# Altium integrated library Al IC.IntLib: 73 symbols
Pins are listed as number, name and electrical type; pins without a type are passive.

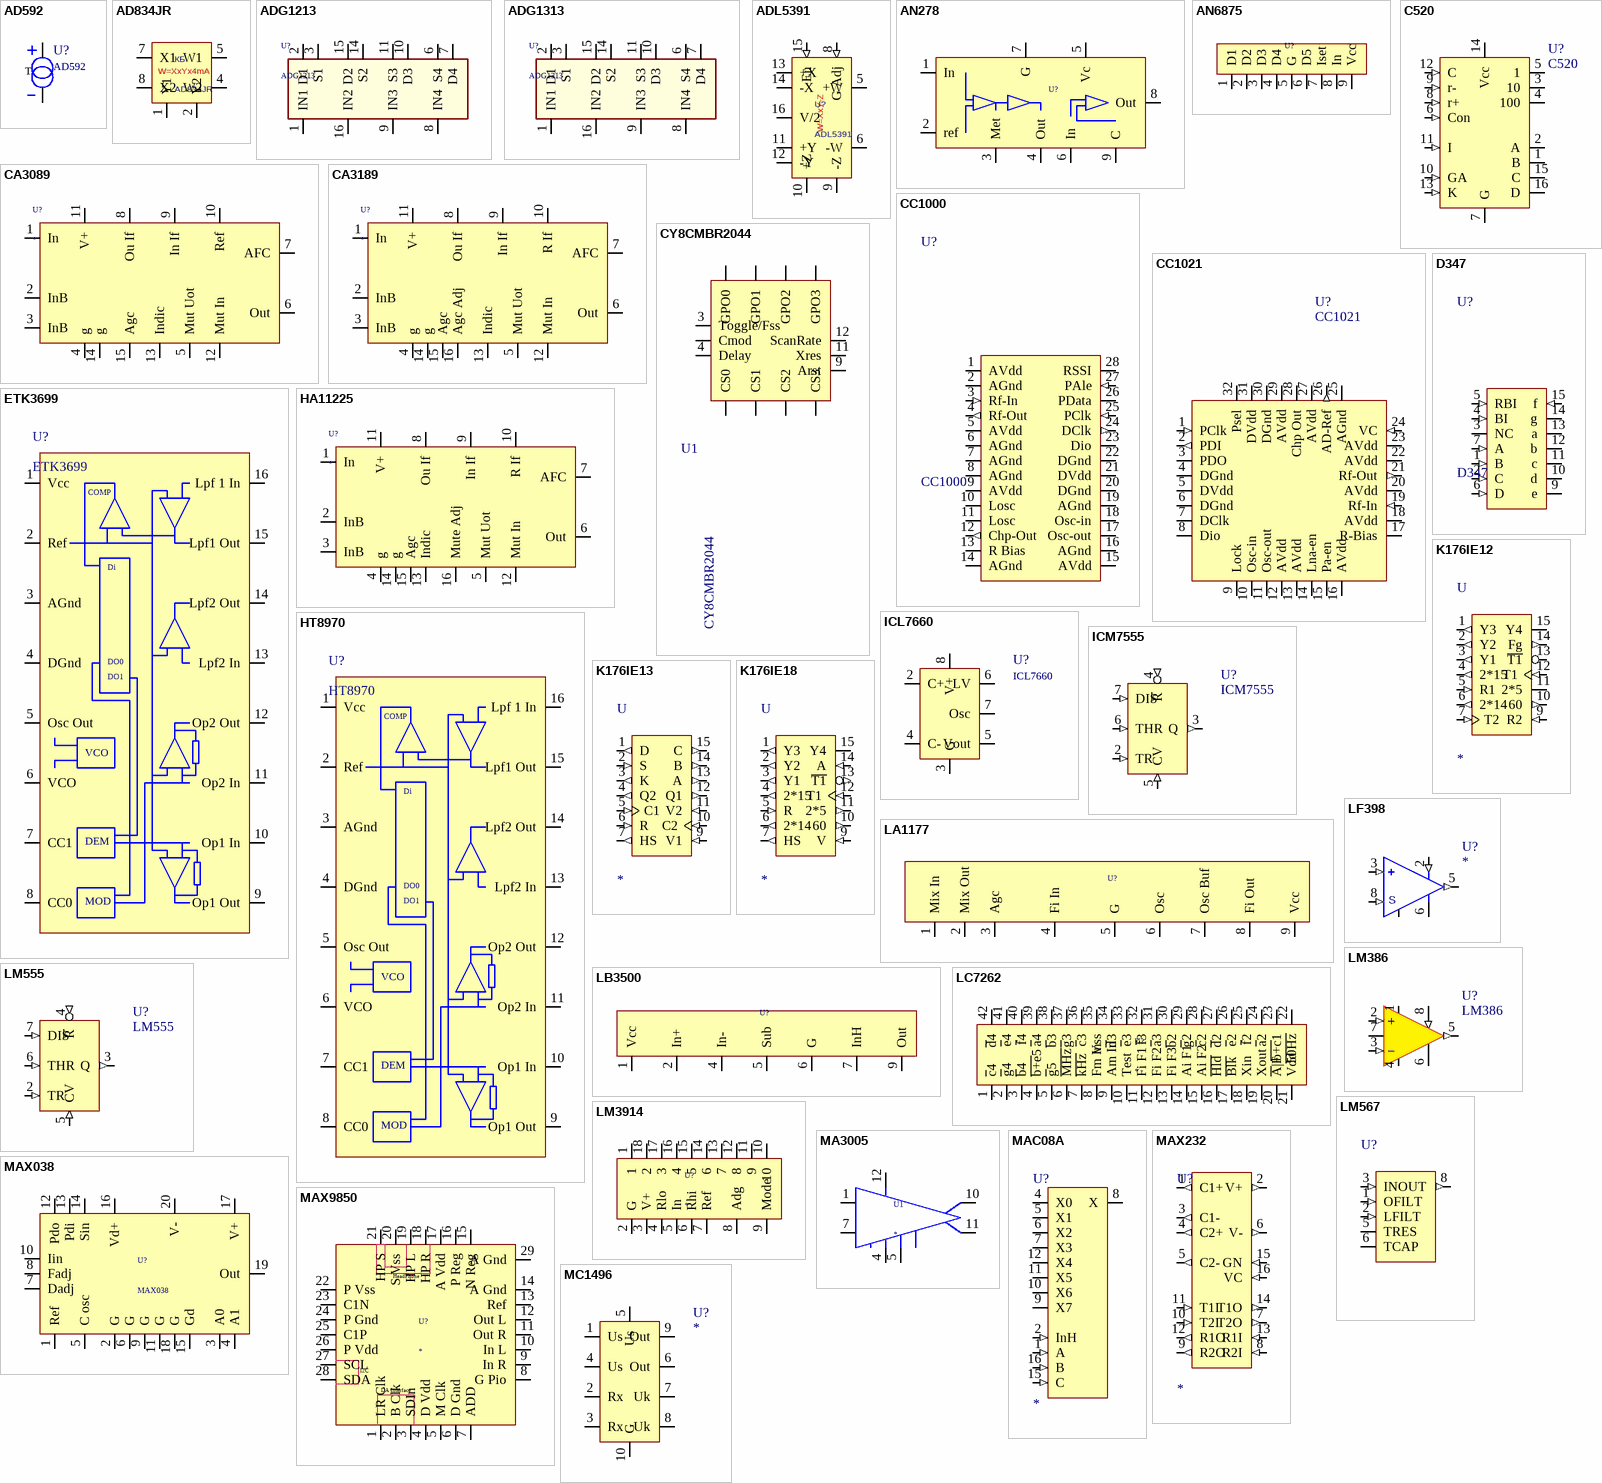
[diagram p0: symbols AD592 to MC1496]

## AD592
designator U?
Temperature Sensor; Price: 5.62
footprint TO92C
pins: 1 (power), 2 nc hidden, 3 (power)
text: T

## AD834JR
designator КБ
500 MHz Four-Quadrant Multiplier 8-18V +11mA -28mA; Price: 64
footprint SO8-150
pins: 1 Y1 (power), 2 Y2 (power), 3 -Vs (power) hidden to -Vs, 4 W2 (power), 5 W1 (power), 6 +Vs (power) hidden to +Vs, 7 X1 (power), 8 X2 (power)
text: W=XxYx4mA

## ADG1213
designator U?
Multiplexer 4x1
pins: 1 IN1, 2 D1, 3 S1, 4 Vss (power) hidden to Vss, 5 Gnd (power) hidden to Gnd, 6 S4, 7 D4, 8 IN4, 9 IN3, 10 D3, 11 S3, 12 NC hidden, 13 Vdd (power) hidden to Vdd, 14 S2, 15 D2, 16 IN2

## ADG1313
designator U?
Multiplexer 4x1
pins: 1 IN1, 2 D1, 3 S1, 4 Vss (power) hidden to Vss, 5 Gnd (power) hidden to Gnd, 6 S4, 7 D4, 8 IN4, 9 IN3, 10 D3, 11 S3, 12 NC hidden, 13 Vdd (power) hidden to Vdd, 14 S2, 15 D2, 16 IN2

## ADL5391
designator U?
2000 MHz Four-Quadrant Multiplier 5V  130mA; Price: 26.5
footprint LFCSP 3x3 0.5mm
pins: 0 PP (power) hidden to g, 1 Vs- (power) hidden to Vs-, 2 Vs+ (power) hidden to Vs+, 3 Vs+ (power) hidden to Vs+, 4 Vs+ (power) hidden to Vs+, 5 +W (power), 6 -W (power), 7 Vs- (power) hidden to Vs-, 8 G Adj (in), 9 -Z, 10 +Z, 11 +Y (power), 12 -Y (power), 13 +X (power), 14 -X (power), 15 En (in), 16 V/2 (power)
text: W=XxY-Z

## AN278
designator U?
FM-IFPre; Price: 0.7
footprint SIP9
pins: 1 In, 2 ref, 3 Met, 4 Out, 5 Vc, 6 In, 7 G, 8 Out, 9 C

## AN6875
designator U?
5 Led Log Dot; Price: 1.8
footprint SIP9
pins: 1 D1, 2 D2, 3 D3, 4 D4, 5 G, 6 D5, 7 Iset, 8 In, 9 Vcc

## C520
designator U?
ADC 3 digital; Price: 13.5
footprint DIL16-300a
pins: 1 B (oc), 2 A (oc), 3 10 (oc), 4 100 (oc), 5 1 (oc), 6 Con (in), 7 G, 8 r+ (in), 9 r- (in), 10 GA (in), 11 I (in), 12 C (in), 13 K (in), 14 Vcc, 15 C (oc), 16 D (oc)

## CA3089
designator U?
FM-IF
footprint DIL16-300a
pins: 1 In, 2 InB, 3 InB, 4 g, 5 Mut Uot, 6 Out, 7 AFC, 8 Ou If, 9 In If, 10 Ref, 11 V+, 12 Mut In, 13 Indic, 14 g, 15 Agc

## CA3189
designator U?
FM-IF
footprint DIL16-300a
pins: 1 In, 2 InB, 3 InB, 4 g, 5 Mut Uot, 6 Out, 7 AFC, 8 Ou If, 9 In If, 10 R If, 11 V+, 12 Mut In, 13 Indic, 14 g, 15 Agc, 16 Agc Adj

## CC1000
designator U?
RX-TX
footprint TSSOP28
pins: 1 AVdd (power), 2 AGnd (power), 3 Rf-In (in), 4 Rf-Out (out), 5 AVdd (power), 6 AGnd (power), 7 AGnd (power), 8 AGnd (power), 9 AVdd (power), 10 Losc, 11 Losc, 12 Chp-Out (out), 13 R Bias, 14 AGnd (power), 15 AVdd (power), 16 AGnd (power), 17 Osc-out, 18 Osc-in, 19 AGnd (power), 20 DGnd (power), 21 DVdd (power), 22 DGnd (power), 23 Dio (io), 24 DClk (out), 25 PClk (in), 26 PData (io), 27 PAle (in), 28 RSSI

## CC1021
designator U?
RX-TX; Price: 8.93
footprint QFN-32
pins: 1 PClk (in), 2 PDI (out), 3 PDO (io), 4 DGnd (power), 5 DVdd (power), 6 DGnd (power), 7 DClk (power), 8 Dio (io), 9 Lock (power), 10 Osc-in, 11 Osc-out, 12 AVdd (power), 13 AVdd (power), 14 Lna-en (power), 15 Pa-en, 16 AVdd (power), 17 R-Bias (power), 18 AVdd, 19 Rf-In (in), 20 AVdd, 21 Rf-Out (out), 22 AVdd (power), 23 AVdd (power), 24 VC (in), 25 AGnd (power), 26 AD-Ref (out), 27 AVdd, 28 Chp Out, 29 AVdd, 30 DGnd (power), 31 DVdd (power), 32 Psel

## CY8CMBR2044
designator U1
Cypress CY8CMBR2044-24LKXI
footprint QFN50P3X3-16V2M (QFN, 16-Leads, Body 3x3mm, Pitch 0.5mm, IPC Low Density)
pins: 1 GPO1, 2 GPO0, 3 Toggle/Fss, 4 Delay (power), 5 CS0, 6 CS1, 7 Vss hidden to Vss, 8 CS2, 9 Arst, 10 CS3, 11 Xres, 12 ScanRate (power), 13 Vcc (power) hidden to Vcc, 14 GPO3, 15 Cmod, 16 GPO2

## D347
designator U?
7 Segment Deshifrator; Price: 4.07
footprint DIL16-300a
pins: 1 B (in), 2 C (in), 3 NC, 4 BI (in), 5 RBI (in), 6 D (in), 7 A (in), 8 GND (power) hidden to Gnd, 9 e (oc), 10 d (oc), 11 c (oc), 12 b (oc), 13 a (oc), 14 g (oc), 15 f (in), 16 Vcc (power) hidden to Vcc
1 alternate drawing of the same symbol

## ETK3699
designator U?
Ехо
footprint DIL16-300a
pins: 1 Vcc, 2 Ref, 3 AGnd, 4 DGnd, 5 Osc Out, 6 VCO, 7 CC1, 8 CC0, 9 Op1 Out, 10 Op1 In, 11 Op2 In, 12 Op2 Out, 13 Lpf2 In, 14 Lpf2 Out, 15 Lpf1 Out, 16 Lpf 1 In
text: COMP; Di; DO0; DO1; DEM; MOD

## HA11225
designator U?
FM-IF
footprint DIL16-300a
pins: 1 In, 2 InB, 3 InB, 4 g, 5 Mut Uot, 6 Out, 7 AFC, 8 Ou If, 9 In If, 10 R If, 11 V+, 12 Mut In, 13 Indic, 14 g, 15 Agc, 16 Mute Adj

## HT8970
designator U?
Ехо
footprint DIL16-300a
pins: 1 Vcc, 2 Ref, 3 AGnd, 4 DGnd, 5 Osc Out, 6 VCO, 7 CC1, 8 CC0, 9 Op1 Out, 10 Op1 In, 11 Op2 In, 12 Op2 Out, 13 Lpf2 In, 14 Lpf2 Out, 15 Lpf1 Out, 16 Lpf 1 In
text: COMP; Di; DO0; DO1; DEM; MOD

## ICL7660
designator U?
DC-DC +5/-5V
footprint DIL8-300a
pins: 1 hidden to NC, 2 C+, 3 G, 4 C-, 5 Vout, 6 LV, 7 Osc, 8 V+

## ICM7555
designator U?
Timer CMOS SMD SO8
footprint SO8-150
pins: 1 GND (power) hidden to GND, 2 TR (in), 3 Q (out), 4 ~{R} (in), 5 CV (in), 6 THR (in), 7 DIS (in), 8 VCC (power) hidden to VCC

## K176IE12
designator U
/60
footprint DIL16-300a
pins: 1 Y3 (out), 2 Y2 (out), 3 Y1 (out), 4 2*15 (out), 5 R1 (in), 6 2*14 (out), 7 T2 (in), 8 VSS (power) hidden to VSS, 9 R2 (in), 10 60 (out), 11 2*5, 12 T1 (in), 13 ~{T1}, 14 Fg (out), 15 Y4, 16 VDD (power) hidden to VDD

## K176IE13
designator U
/60
footprint DIL16-300a
pins: 1 D (out), 2 S (in), 3 K (out), 4 Q2 (out), 5 C1 (in), 6 R (in), 7 HS (out), 8 VSS (power) hidden to VSS, 9 V1 (in), 10 C2 (in), 11 V2 (in), 12 Q1 (out), 13 A (out), 14 B (out), 15 C (out), 16 VDD (power) hidden to VDD

## K176IE18
designator U
/60
footprint DIL16-300a
pins: 1 Y3 (out), 2 Y2 (out), 3 Y1 (out), 4 2*15 (out), 5 R (in), 6 2*14 (out), 7 HS (out), 8 VSS (power) hidden to VSS, 9 V (in), 10 60 (out), 11 2*5 (out), 12 T1 (in), 13 ~{T1} (out), 14 A (in), 15 Y4, 16 VDD (power) hidden to VDD

## LA1177
designator U?
FM Tuner 8-9V; Price: 1.2
footprint SIP9
pins: 1 Mix In, 2 Mix Out, 3 Agc, 4 Fi In, 5 G, 6 Osc, 7 Osc Buf, 8 Fi Out, 9 Vcc

## LB3500
designator U?
1/8 Prescaler 30-150MHz; Price: 2.25
footprint SIP9
pins: 1 Vcc, 2 In+, 3 nc hidden, 4 In-, 5 Sub, 6 G, 7 InH, 8 nc hidden, 9 Out

## LC7262
designator U?
Цифрова Скала FM-AM; Price: 4.5
footprint DIL42S-600
pins: 1 ~{c}4 (oc), 2 ~{g}4 (oc), 3 ~{b}4 (oc), 4 ~{b+e}5 (oc), 5 ~{g}5 (oc), 6 ~{MHz} (oc), 7 ~{kHz} (oc), 8 Fm In (oc), 9 Am In (oc), 10 Test (oc), 11 Fi F1 (oc), 12 Fi F2 (oc), 13 Fi F3 (oc), 14 Ai F1 (oc), 15 Ai F2 (oc), 16 ~{Hld} (oc), 17 ~{Blk} (oc), 18 Xin (oc), 19 Xout (oc), 20 ~{A}|F (oc), 21 Vdd (oc), 22 ~{50Hz} (oc), 23 ~{b+c}1 (oc), 24 ~{a}2 (oc), 25 ~{f}2 (oc), 26 ~{e}2 (oc), 27 ~{d}2 (oc), 28 ~{c}2 (oc), 29 ~{g}2 (oc), 30 ~{b}2 (oc), 31 ~{a}3 (oc), 32 ~{f}3 (oc), 33 ~{e}3 (oc), 34 ~{d}3 (oc), 35 Vss (oc), 36 ~{c}3 (oc), 37 ~{g}3 (oc), 38 ~{b}3 (oc), 39 ~{a}4 (oc), 40 ~{f}4 (oc), 41 ~{e}4 (oc), 42 ~{d}4 (oc)

## LF398
designator U?
S-H; Price: 2.018
footprint DIL8-300a
pins: 1 V+ (power) hidden to V+, 2 OFFSET (in), 3 IN (in), 4 V- (power) hidden to V-, 5 OUT (out), 6 CAP, 7 LOGRF (in), 8 LOG (in)
text: S

## LM386
designator U?
1W
footprint DIL8-300a
pins: 1 GAIN (in), 2 IN+ (in), 3 IN- (in), 4 GND, 5 OUT (out), 6 V+, 7 BYPASS, 8 GAIN (in)

## LM555
designator U?
Timer
footprint DIL8-300a
footprint SO8-150
pins: 1 GND (power) hidden to GND, 2 TR (in), 3 Q (out), 4 ~{R} (in), 5 CV (in), 6 THR (in), 7 DIS (in), 8 VCC (power) hidden to VCC

## LM567
designator U?
PLL
footprint DIL8-300a
pins: 1 OFILT (in), 2 LFILT (in), 3 IN (in), 4 V+ (power) hidden to V+, 5 TRES, 6 TCAP, 7 GND (power) hidden to GND, 8 OUT (out)

## LM3914
designator U?
10 Led Bar/Dot Lin; Price: 3.9
footprint DIL18-300a
pins: 1 (oc), 2 G (oc), 3 V+ (oc), 4 Rlo (oc), 5 In (oc), 6 Rhi (oc), 7 Ref (oc), 8 Adg (oc), 9 Mode (oc), 10 (oc), 11 9 (oc), 12 8 (oc), 13 7 (oc), 14 6 (oc), 15 5 (oc), 16 4 (oc), 17 3 (oc), 18 2 (oc)

## MA3005
designator U1
Dif UC
footprint TO12
pins: 1 +I, 2 e (power) hidden to Gnd, 3 B hidden, 4, 5, 6 hidden, 7 -I, 8 Ve (power) hidden to Ve, 9 Vc (power) hidden to Vc, 10 +Out, 11 -Out, 12 +V

## MAC08A
designator U?
Multiplexer 8x1
footprint DIL16-300a
pins: 1 A (in), 2 InH (in), 3 VEE (power) hidden to VEE, 4 X0 (io), 5 X1 (io), 6 X2 (io), 7 X3 (io), 8 X (io), 9 X7 (io), 10 X6 (io), 11 X5 (io), 12 X4 (io), 13 VDD (power) hidden to VDD, 14 VSS (power) hidden to VSS, 15 C (in), 16 B (in)

## MAX038
designator U?
Function Gen; Price: 20лв
footprint DIL20-300a
pins: 1 Ref, 2 G, 3 A0, 4 A1, 5 C osc, 6 G, 7 Dadj, 8 Fadj, 9 G, 10 Iin, 11 G, 12 Pdo, 13 Pdi, 14 Sin, 15 Gd, 16 Vd+, 17 V+, 18 G, 19 Out, 20 V-

## MAX232
designator U?
RS232
footprint DIL16-300a
pins: 1 C1+ (out), 2 V+ (out), 3 C1- (out), 4 C2+ (out), 5 C2- (out), 6 V- (out), 7 T2O (out), 8 R2I (in), 9 R2O (out), 10 T2I (in), 11 T1I (in), 12 R1O (out), 13 R1I (in), 14 T1O (out), 15 GN (in), 16 VC (in)

## MAX9850
designator U?
footprint QFN28 (QFN, 28-Leads, Body 5x5mm, Pitch 0.5mm, NSC Recommended)
pins: 1 LR Clk, 2 B Clk, 3 SDIn, 4 D Vdd, 5 M Clk, 6 D Gnd, 7 ADD, 8 G Pio, 9 In R, 10 In L, 11 Out R, 12 Out L, 13 Ref, 14 A Gnd, 15 N Reg, 16 P Reg, 17 A Vdd, 18 HP R, 19 HP L, 20 S Vss, 21 HP S, 22 P Vss, 23 C1N, 24 P Gnd, 25 C1P, 26 P Vdd, 27 SCL, 28 SDA, 29 A Gnd
text: HeadPhone; I2C; DA Interface

## MC1496
designator U?
Driver
footprint TO10 (Footprint not found)
pins: 1 Us, 2 Rx, 3 Rx, 4 Us, 5 Us, 6 Out, 7 Uk, 8 Uk, 9 Out, 10 G

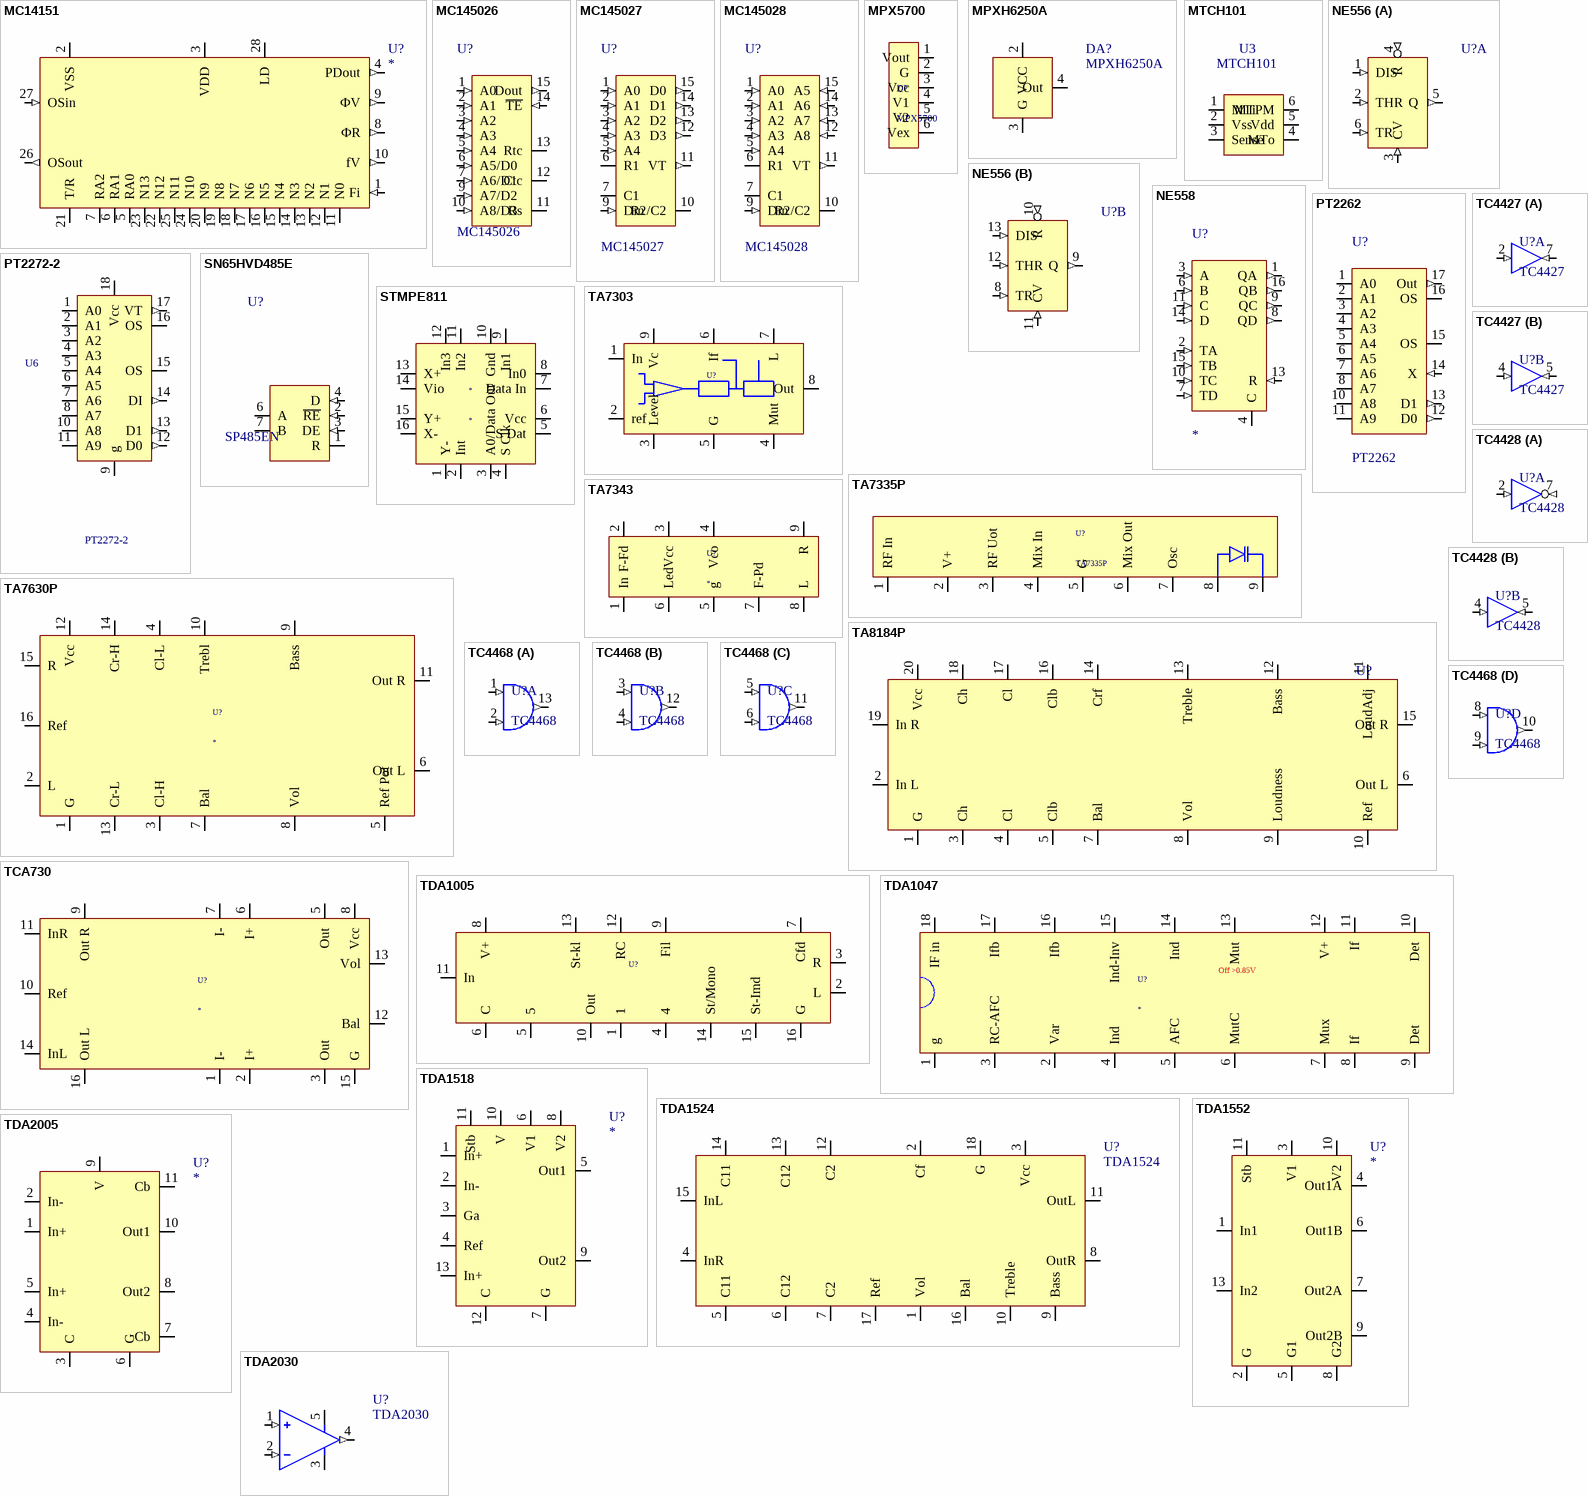
[diagram p1: symbols MC14151 to TDA2030]

## MC14151
designator U?
PLL
footprint DIL28-600a
pins: 1 Fi (in), 2 VSS (power), 3 VDD (power), 4 PDout (out), 5 RA0, 6 RA1, 7 RA2, 8 ФR (out), 9 ФV (out), 10 fV (out), 11 N0, 12 N1, 13 N2, 14 N3, 15 N4, 16 N5, 17 N6, 18 N7, 19 N8, 20 N9, 21 T/R, 22 N12, 23 N13, 24 N10, 25 N11, 26 OSout (out), 27 OSin (in), 28 LD (oc)

## MC145026
designator U?
Coder
footprint DIL16-300a
pins: 1 A0 (in), 2 A1 (in), 3 A2 (in), 4 A3 (in), 5 A4 (in), 6 A5/D0 (in), 7 A6/D1 (in), 8 Vss (power) hidden to Vss, 9 A7/D2 (in), 10 A8/D3 (in), 11 Rs, 12 Ctc, 13 Rtc, 14 ~{TE} (in), 15 Dout (out), 16 Vdd (power) hidden to Vdd

## MC145027
designator U?
DeCoder
footprint DIL16-300a
pins: 1 A0 (in), 2 A1 (in), 3 A2 (in), 4 A3 (in), 5 A4 (in), 6 R1, 7 C1, 8 Vss (power) hidden to Vss, 9 Din (in), 10 R2/C2, 11 VT (out), 12 D3 (out), 13 D2 (out), 14 D1 (out), 15 D0 (out), 16 Vdd (power) hidden to Vdd

## MC145028
designator U?
DeCoder
footprint DIL16-300a
pins: 1 A0 (in), 2 A1 (in), 3 A2 (in), 4 A3 (in), 5 A4 (in), 6 R1, 7 C1, 8 Vss (power) hidden to Vss, 9 Din (in), 10 R2/C2, 11 VT (out), 12 A8 (in), 13 A7 (in), 14 A6 (in), 15 A5 (in), 16 Vdd (power) hidden to Vdd

## MPX5700
designator D?
Датчик Налягане; TargetPrice: *
footprint MPX5700AP - 1
footprint MPX5700AP
footprint MPX5700AP - 6
pins: 1 Vout, 2 G, 3 Vcc, 4 V1, 5 V2, 6 Vex

## MPXH6250A
designator DA?
Datchik Haliagane
footprint MPXH-8
pins: 2 VCC (power), 3 G (power), 4 Out (power)

## MTCH101
designator U3
footprint SOT23-6
pins: 1 MTi, 2 Vss, 3 Sense, 4 MTo, 5 Vdd, 6 MTPM

## NE556
designator U?
2 x Timer
footprint DIL14-300
part A pins: 1 DIS (in), 2 THR (in), 3 CV (in), 4 R (in), 5 Q (out), 6 TR (in), 7 G (power) hidden to g, 14 Vcc (power) hidden to VCC
part B pins: 8 TR (in), 9 Q (out), 10 R (in), 11 CV (in), 12 THR (in), 13 DIS (in)

## NE558
designator U?
4 x Timer
footprint DIL16-300a
pins: 1 QA (out), 2 TA (in), 3 A (in), 4 C, 5 VCC (power) hidden to VCC, 6 B (in), 7 TD (in), 8 QD (out), 9 QC (out), 10 TC (in), 11 C (in), 12 GND (power) hidden to GND, 13 R (in), 14 D (in), 15 TB (in), 16 QB (out)

## PT2262
designator U?
Coder
footprint DIL18-300a
pins: 1 A0, 2 A1, 3 A2, 4 A3, 5 A4, 6 A5, 7 A6, 8 A7, 9 g (power) hidden to g, 10 A8, 11 A9, 12 D0 (out), 13 D1 (out), 14 X (in), 15 OS, 16 OS, 17 Out (out), 18 Vcc (power) hidden to Vcc

## PT2272-2
designator U6
DeCoder
footprint DIL18-300a
pins: 1 A0, 2 A1, 3 A2, 4 A3, 5 A4, 6 A5, 7 A6, 8 A7, 9 g (power) hidden to g, 10 A8, 11 A9, 12 D0 (out), 13 D1 (out), 14 DI (out), 15 OS, 16 OS, 17 VT (out), 18 Vcc (power) hidden to Vcc

## SN65HVD485E
designator U?, comment SP485EN
Half Duplex RS-485  10 Mbps, 5 V; Receivers Per Package: 1; ComponentLink1URL: http://www.ti.com/general/docs/lit/getliterature.tsp?genericPartNumber=SN65HVD485E&fileType=pdf; SubFamily: RS-485; DatasheetVersion: SLLS612C; PackageDescription: 8-Pin Thin Small Outline Package 3 x 3 mm Body ,0.65 mm Pitch
footprint SSOP8 (0.65mm)
pins: 1 R (hiz), 2 ~{RE} (in), 3 DE (in), 4 D (in), 5 G (power) hidden to g, 6 A (io), 7 B (io), 8 VCC (power) hidden to Vcc

## STMPE811
designator *
footprint QFN16(3x3x1) 0.5mm (QFN, 16-Leads, Body 3x3mm, Pitch 0.5mm, IPC Low Density)
pins: 1 Y-, 2 Int, 3 A0/Data Out, 4 S Clk, 5 S Dat, 6 Vcc, 7 Data In, 8 In0, 9 In1, 10 Gnd, 11 In2, 12 In3, 13 X+, 14 Vio, 15 Y+, 16 X-, 17 hidden

## TA7303
designator U?
FM-IF; Price: 1
footprint SIP9
pins: 1 In, 2 ref, 3 Level, 4 Mut, 5 G, 6 If, 7 L, 8 Out, 9 Vc

## TA7335P
designator U?
FM Tuner 2-8V
footprint SIP9
pins: 1 RF In, 2 V+, 3 RF Uot, 4 Mix In, 5 G, 6 Mix Out, 7 Osc, 8 C adj, 9 C adj

## TA7343
designator U?
MPX
footprint SIP9
pins: 1 In, 2 F-Fd, 3 Vcc, 4 Vco, 5 g, 6 Led, 7 F-Pd, 8 L, 9 R

## TA7630P
designator U?
Volume Tone Control; Price: 1.5
footprint DIL16-300a
pins: 1 G, 2 L, 3 Cl-H, 4 Cl-L, 5 Ref Pot, 6 Out L, 7 Bal, 8 Vol, 9 Bass, 10 Trebl, 11 Out R, 12 Vcc, 13 Cr-L, 14 Cr-H, 15 R, 16 Ref

## TA8184P
designator U?
Volume Tone Control; Price: 2
footprint DIL20-300a
pins: 1 G (power), 2 In L, 3 Ch, 4 Cl, 5 Clb, 6 Out L, 7 Bal (power), 8 Vol (power), 9 Loudness (power), 10 Ref (power), 11 LoudAdj (power), 12 Bass (power), 13 Treble (power), 14 Crf (power), 15 Out R, 16 Clb, 17 Cl, 18 Ch, 19 In R, 20 Vcc (power)

## TC4427
designator U?
MOS Bufer; Price: 1
footprint SO8-150
part A pins: 2 (in), 3 G (power) hidden to G, 6 Vdd (power) hidden to Vdd, 7 (in)
part B pins: 4 (in), 5 (in)

## TC4428
designator U?
MOS Bufer; Price: 1
footprint SO8-150
part A pins: 2 (in), 3 G (power) hidden to G, 6 Vdd (power) hidden to Vdd, 7 (in)
part B pins: 4 (in), 5 (in)

## TC4468
designator U?
MOS Bufer; Price: 2.7
footprint DIL14-300
part A pins: 1 (in), 2 (in), 7 G (power) hidden to G, 13 (out), 14 Vdd (power) hidden to Vdd
part B pins: 3 (in), 4 (in), 12 (out)
part C pins: 5 (in), 6 (in), 11 (out)
part D pins: 8 (in), 9 (in), 10 (out)

## TCA730
designator U?
Volume Control; Price: 0.9
footprint DIL16-300a
pins: 1 I-, 2 I+, 3 Out, 4 nc hidden, 5 Out, 6 I+, 7 I-, 8 Vcc, 9 Out R, 10 Ref, 11 InR, 12 Bal, 13 Vol, 14 InL, 15 G, 16 Out L

## TDA1005
designator U?
MPX; Price: 0.6
footprint DIL16-300
pins: 1, 2 L, 3 R, 4, 5, 6 C, 7 Cfd, 8 V+ (power), 9 Fil, 10 Out, 11 In, 12 RC, 13 St-kl, 14 St/Mono, 15 St-Imd, 16 G (power)

## TDA1047
designator U?
FM-IF; Price: 2.6
footprint DIL18-300a
pins: 1 g, 2 Var, 3 RC-AFC, 4 Ind, 5 AFC, 6 MutC, 7 Mux, 8 If, 9 Det, 10 Det, 11 If, 12 V+, 13 Mut, 14 Ind, 15 Ind-Inv, 16 Ifb, 17 Ifb, 18 IF in
text: Off >0.85V

## TDA1518
designator U?
PA
footprint SOT141-6
pins: 1 In+, 2 In-, 3 Ga, 4 Ref, 5 Out1, 6 V1, 7 G, 8 V2, 9 Out2, 10 V, 11 Stb, 12 C, 13 In+

## TDA1524
designator U?
Volume Tone Control
footprint DIL18-300a
pins: 1 Vol (power), 2 Cf (power), 3 Vcc (power), 4 InR, 5 C11, 6 C12, 7 C2, 8 OutR, 9 Bass (power), 10 Treble (power), 11 OutL, 12 C2, 13 C12, 14 C11, 15 InL, 16 Bal (power), 17 Ref (power), 18 G (power)

## TDA1552
designator U?
PA
footprint SOT141-6
pins: 1 In1, 2 G, 3 V1, 4 Out1A, 5 G1, 6 Out1B, 7 Out2A, 8 G2, 9 Out2B, 10 V2, 11 Stb, 12 nc hidden to nc, 13 In2

## TDA2005
designator U?
PA
footprint Multiwatt 11V
pins: 1 In+, 2 In-, 3 C, 4 In-, 5 In+, 6 G, 7 Cb, 8 Out2, 9 V, 10 Out1, 11 Cb

## TDA2030
designator U?
PA; Price: 2.018
footprint TO220-5 (Footprint not found)
pins: 1 In (in), 2 In (in), 3 r, 4 Out (out), 5 V- (power)

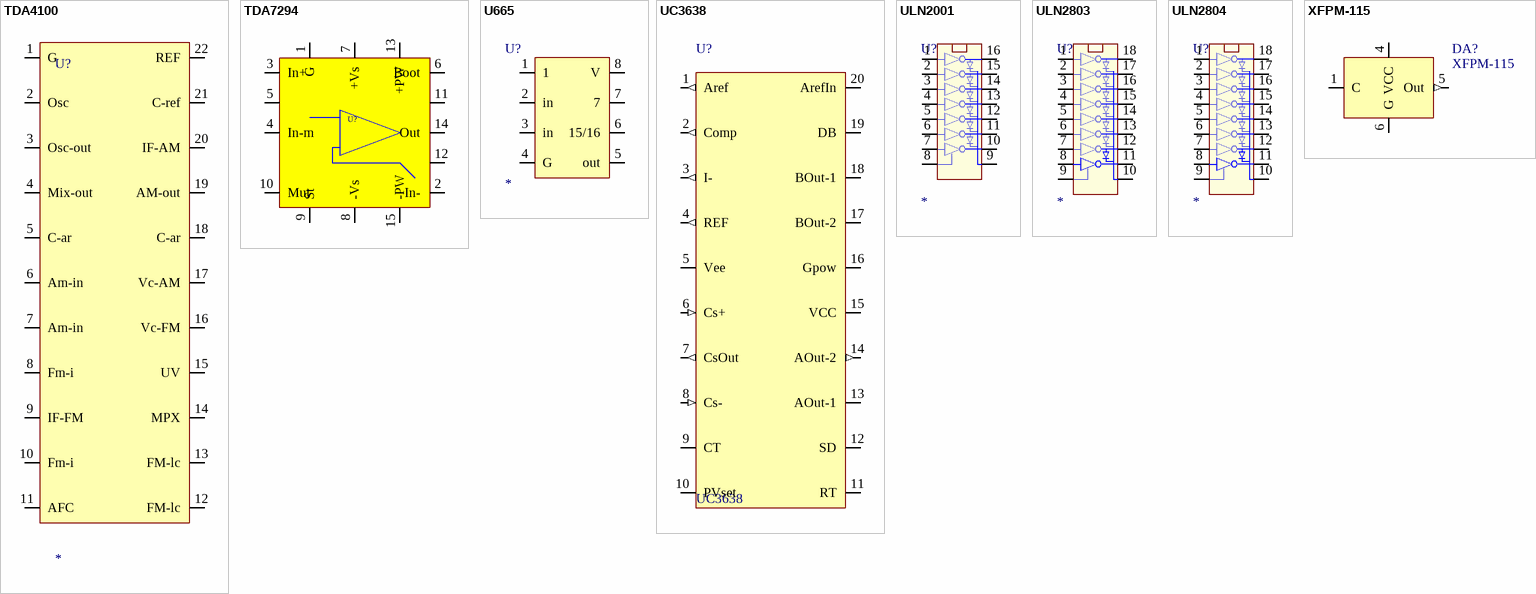
[diagram p2: symbols TDA4100 to XFPM-115]

## TDA4100
designator U?
AM + FM-IF
footprint DIL22-400
pins: 1 G, 2 Osc, 3 Osc-out, 4 Mix-out, 5 C-ar, 6 Am-in, 7 Am-in, 8 Fm-i, 9 IF-FM, 10 Fm-i, 11 AFC, 12 FM-lc, 13 FM-lc, 14 MPX, 15 UV, 16 Vc-FM, 17 Vc-AM, 18 C-ar, 19 AM-out, 20 IF-AM, 21 C-ref, 22 REF

## TDA7294
designator U?
70W -/+40V 4oM; Price: 5
footprint Multiwatt 15V
pins: 1 G, 2 In-, 3 In+, 4 In-m, 5, 6 Boot, 7 +Vs, 8 -Vs, 9 St, 10 Mut, 11, 12, 13 +PW, 14 Out, 15 -PW

## U665
designator U?
HF /15/16
footprint DIL8-300a
pins: 1, 2 in, 3 in, 4 G, 5 out, 6 15/16, 7, 8 V

## UC3638
designator U?
Power Driver; Price: 11.76
footprint DIL20-300a
pins: 1 Aref (out), 2 Comp (out), 3 I- (out), 4 REF (out), 5 Vee (power), 6 Cs+ (in), 7 CsOut (out), 8 Cs- (in), 9 CT, 10 PVset, 11 RT, 12 SD, 13 AOut-1 (oc), 14 AOut-2 (out), 15 VCC (power), 16 Gpow (power), 17 BOut-2 (power), 18 BOut-1 (power), 19 DB (power), 20 ArefIn (power)
1 alternate drawing of the same symbol

## ULN2001
designator U?
Driver
footprint DIL16-300a
footprint SO16-150
pins: 1, 2, 3, 4, 5, 6, 7, 8, 9, 10, 11, 12, 13, 14, 15, 16

## ULN2803
designator U?
50V 0.5A CMOS
footprint DIL18-300a
pins: 1, 2, 3, 4, 5, 6, 7, 8, 9, 10, 11, 12, 13, 14, 15, 16, 17, 18

## ULN2804
designator U?
50V 0.5A TTL
footprint DIL18-300a
footprint SO18-300
pins: 1, 2, 3, 4, 5, 6, 7, 8, 9, 10, 11, 12, 13, 14, 15, 16, 17, 18

## XFPM-115
designator DA?
Datchik Haliagane
footprint XFPM-115
pins: 1 C, 2 nc hidden, 3 nc hidden, 4 VCC (power), 5 Out (out), 6 G (power)